# Altium footprint library SMD-RCL.PcbLib: 111 footprints (part 7 of 7)
Each footprint in its own frame and in the unit in brackets; x right, y up, seen from the top. Pads: shape width x height; smd on the part's side, far side on the other; paste and mask are expansions set on the pad; w line width, h text height; cw(c..) or ccw(c..) is an arc to the next point about the centre after c.
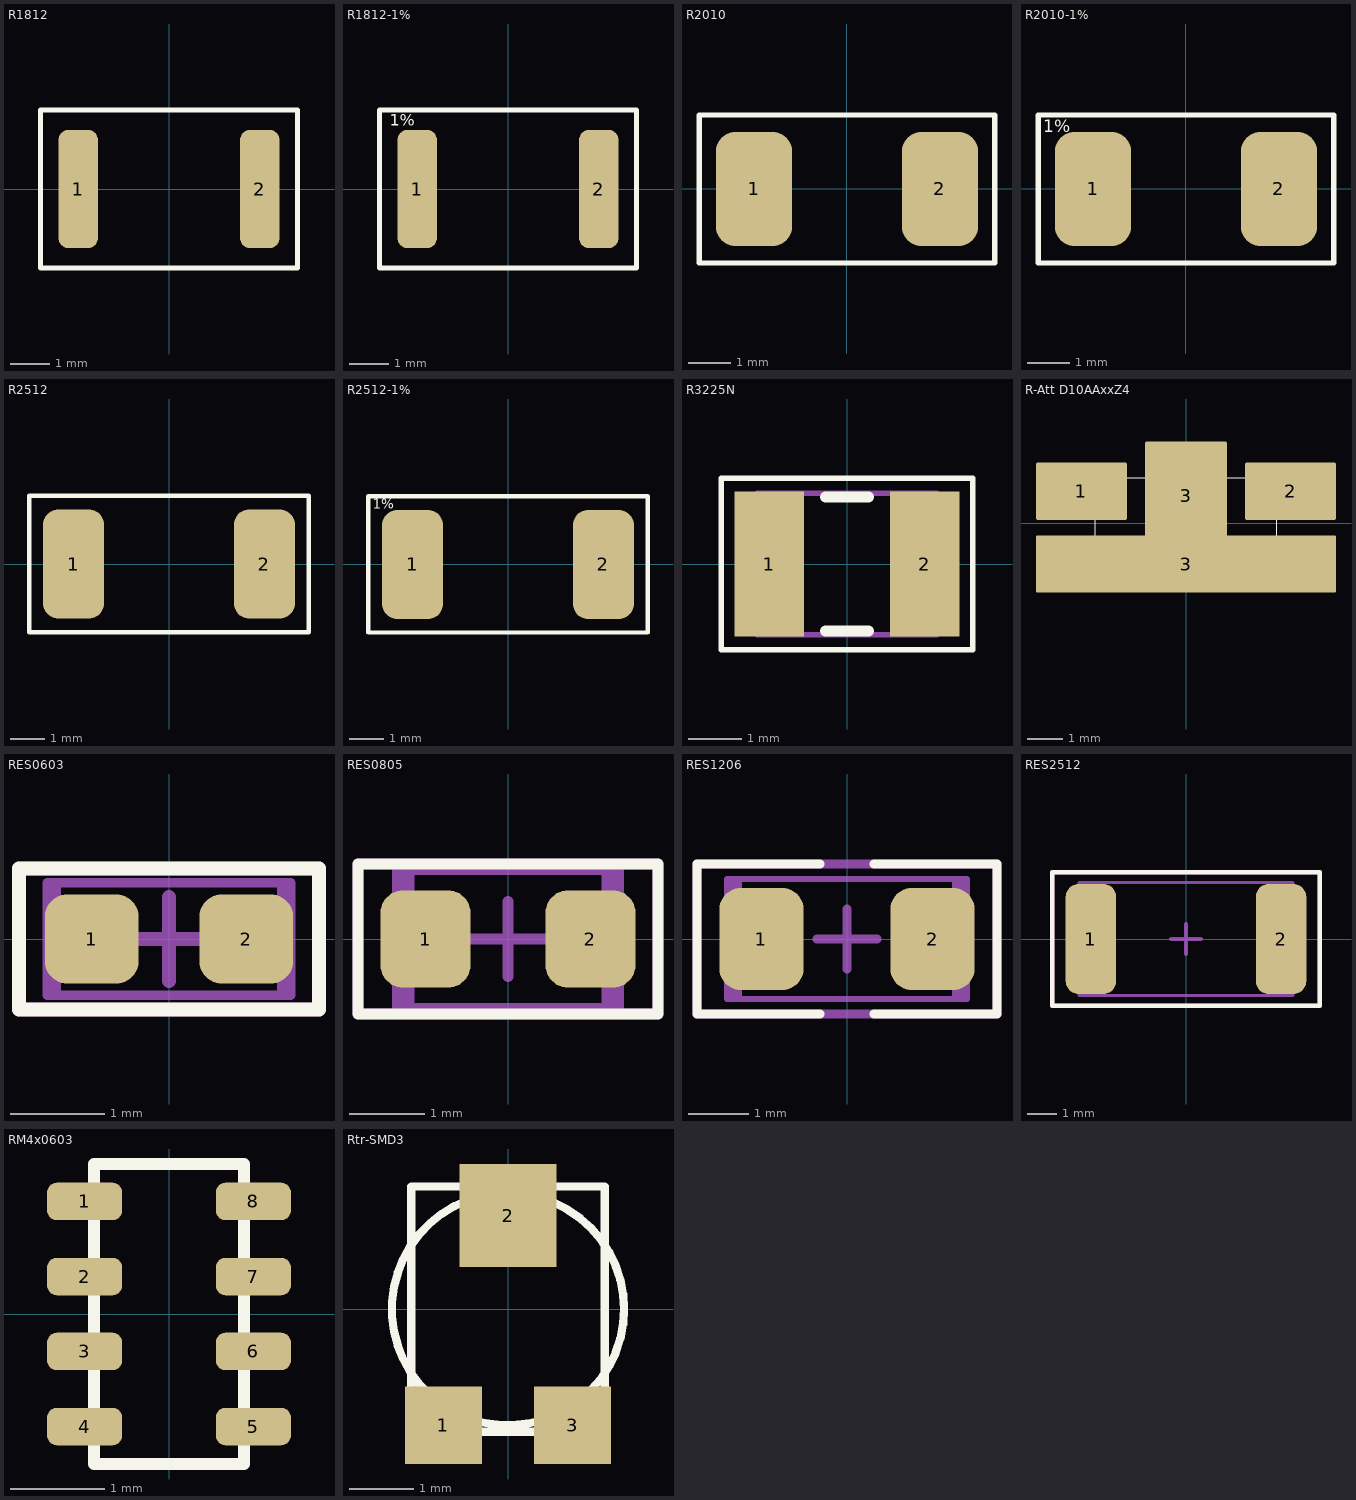
[diagram p6: the footprints below, top view; thin cyan lines are the x and y axes]

## R1812 [mm]
pads (2):
  rrect50% 1x3 smd: 1(-2.3,0) 2(2.3,0)
Top Overlay:
  lines w0.125: -3.25,-2 -3.25,2 3.25,2 3.25,-2 -3.25,-2
3D body "SMD R-1812.STEP": height 0.6, standoff 0, extent -2.25,-1.6 2.25,1.6

## R1812-1% [mm]
pads (2):
  rrect50% 1x3 smd: 1(-2.3,0) 2(2.3,0)
Top Overlay:
  lines w0.125: -3.25,-2 3.25,-2 3.25,2 -3.25,2 -3.25,-2
  text "1%" at -3,1.5 h0.5
3D body "SMD R-1812-1%.STEP": height 0.6, standoff 0, extent -2.276,-1.6 2.224,1.6

## R2010 [mm]
pads (2):
  rrect50% 1.8x2.7 smd: 1(-2.2,0) 2(2.2,0)
Top Overlay:
  lines w0.125: -3.5,-1.75 -3.5,1.75 3.5,1.75 3.5,-1.75 -3.5,-1.75
3D body "SMD R-2010.STEP": height 0.62, standoff 0, extent -2.502,-1.244 2.502,1.246

## R2010-1% [mm]
pads (2):
  rrect50% 1.8x2.7 smd: 1(-2.2,0) 2(2.2,0)
Top Overlay:
  lines w0.125: -3.5,-1.75 3.5,-1.75 3.5,1.75 -3.5,1.75 -3.5,-1.75
  text "1%" at -3.373,1.242 h0.5
3D body "SMD R-2010-1%.STEP": height 0.62, standoff 0, extent -2.502,-1.244 2.502,1.245

## R2512 [mm]
pads (2):
  rrect50% 1.8x3.2 smd: 1(-2.8,0) 2(2.8,0)
Top Overlay:
  lines w0.125: -4.1,-2 -4.1,2 4.1,2 4.1,-2 -4.1,-2
3D body "SMD R-2512.STEP": height 0.62, standoff 0, extent -3.159,-1.6 3.16,1.6

## R2512-1% [mm]
pads (2):
  rrect50% 1.8x3.2 smd: 1(-2.8,0) 2(2.8,0)
Top Overlay:
  lines w0.125: -4.1,-2 4.1,-2 4.1,2 -4.1,2 -4.1,-2
  text "1%" at -3.962,1.524 h0.5
3D body "SMD R-2512-1%.STEP": height 0.62, standoff 0, extent -3.159,-1.6 3.16,1.6

## R3225N [mm] "Chip Resistor, Body 3.2x2.5mm, IPC Medium Density"
height 0.71
pads (2):
  rect 1.3x2.7 smd: 1(-1.45,0) 2(1.45,0)
Top Overlay:
  lines w0.1: -2.35,-1.6 2.35,-1.6 2.35,1.6 -2.35,1.6 -2.35,-1.6
  lines w0.2: -0.4,-1.25 0.4,-1.25 ; -0.4,1.25 0.4,1.25
Assembly_draw:
  lines w0.1: -1.675,-1.32 -1.675,1.32 1.675,1.32 1.675,-1.32 -1.675,-1.32
3D body: height 0.71, standoff 0, extent -1.675,-1.32 1.675,1.32

## R-Att D10AAxxZ4 [mil]
pads (4):
  rrect5% 100x63 smd: 1(-115,35) 2(115,35)
  rrect5% 330x63 smd: 3(0,-45)
  rrect5% 90x120 smd: 3(0,30)
Top Layer:
  lines w1: -96,10 -96,45 -70,45 -70,10 -96,10 ; -88,-50 -88,-15 -40,-15 -40,45 40,45 40,-15 88,-15 88,-50 -88,-50 ; 70,10 70,45 96,45 96,10 70,10
Top Overlay:
  lines w1: -100,-50 -100,10 -98,10 ccw(c-98,12) -96,12 -96,50 96,50 96,12 ccw(c98,12) 98,10 100,10 100,-50 40,-50 40,-48 ccw(c38,-48) 38,-46 -38,-46 ccw(c-38,-48) -40,-48 -40,-50 -100,-50
3D body: height 25, standoff 0, extent -100,-50 100,50
3D body: height 26, standoff 25, extent -96,-46 96,45

## RES0603 [mm] "Chip Capacitor, 2-Leads, Body 1,60x0,83mm, IPC Medium Density"
height 0.6
pads (2):
  rrect50% 1x0.95 smd: 1(-0.825,0) 2(0.825,0)
Top Overlay:
  lines w0.15: -1.6,-0.75 -1.6,0.75 0,0.75 1.6,0.75 1.6,-0.75 0,-0.75 -1.6,-0.75
Assembly_draw:
  lines w0.1: -1.2,-0.6 -1.2,0.6 ; 1.2,-0.6 1.2,0.6 ; -1.3,-0.6 -1.3,0.6 1.3,0.6 1.3,-0.6 -1.3,-0.6
Mechanical_clearance:
  lines w0.15: -0.45,0 0.45,0 ; 0,-0.45 0,0.45 ; -1.6,-0.75 -1.6,0.75 1.6,0.75 1.6,-0.75 -1.6,-0.75
3D body "SMD R-0603.STEP": height 0.45, standoff -0.01, extent -0.8,-0.4 0.8,0.4

## RES0805 [mm] "Chip Resistor, 2-Leads, Body 2,00x1,25mm, IPC Medium Density"
height 0.7
pads (2):
  rrect50% 1.2x1.3 smd: 1(-1.1,0) 2(1.1,0)
Top Overlay:
  lines w0.15: -2,-1 2,-1 2,1 -2,1 -2,-1
Assembly_draw:
  rectangle: -1.5,-0.9 -1.3,0.9
  rectangle: 1.3,-0.9 1.5,0.9
  lines w0.1: -1.3,-0.9 -1.3,0.9 ; 1.3,-0.9 1.3,0.9 ; -1.5,-0.9 -1.5,0.9 1.5,0.9 1.5,-0.9 -1.5,-0.9
Mechanical_clearance:
  lines w0.15: -0.5,0 0.5,0 ; 0,-0.5 0,0.5 ; -2,-1 2,-1 2,1 -2,1 -2,-1
3D body "R-0805.STEP": height 0.6, standoff 0, extent -1,-0.625 1,0.625

## RES1206 [mm] "Chip Resistor, 2-Leads, Body 3,20x1,60mm, IPC Medium Density"
height 0.7
pads (2):
  rrect50% 1.4x1.7 smd: 1(-1.425,0) 2(1.425,0)
Top Overlay:
  lines w0.15: -0.45,-1.25 -2.5,-1.25 -2.5,1.25 -0.45,1.25 ; 0.45,-1.25 2.5,-1.25 2.5,1.25 0.45,1.25
Assembly_Text_Top:
  text ".Designator / .Comment" at -2.2,-0.7 h1
Assembly_draw:
  rectangle: -1.95,-1 -1.75,1
  rectangle: 1.75,-1 1.95,1
  lines w0.1: -2,-1 2,-1 2,1 -2,1 -2,-1
Mechanical_clearance:
  lines w0.15: -0.5,0 0.5,0 ; 0,-0.5 0,0.5 ; -2.5,-1.25 2.5,-1.25 2.5,1.25 -2.5,1.25 -2.5,-1.25
3D body "R-1206 (2).STEP": height 0.6, standoff 0, extent -1.6,-0.8 1.6,0.8

## RES2512 [mm]
height 0.7
pads (2):
  rrect50% 1.7x3.7 smd: 1(-3.2,0) 2(3.2,0)
Top Overlay:
  lines w0.15: -4.5,-2.25 -4.5,2.25 4.5,2.25 4.5,-2.25 -4.5,-2.25
Assembly_Text_Top:
  text ".Designator / .Comment" at -4.3,-1.5 h2
Assembly_draw:
  rectangle: 2.8,-1.9 3.6,1.9
  rectangle: -3.6,-1.9 -2.8,1.9
  lines w0.1: -3.3,-1.9 -3.3,1.9 ; 3.3,-1.9 3.3,1.9 ; -3.6,-1.9 -3.6,1.9 3.6,1.9 3.6,-1.9 -3.6,-1.9
Mechanical_clearance:
  lines w0.15: -0.5,0 0.5,0 ; 0,-0.5 0,0.5 ; -4.5,-2.25 -4.5,2.25 4.5,2.25 4.5,-2.25 -4.5,-2.25
3D body "SMD R-2512.STEP": height 0.62, standoff 0, extent -3.159,-1.6 3.16,1.6

## RM4x0603 [mm]
pads (8):
  rrect50% 0.8x0.4 smd: 1(-0.9,1.2) 2(-0.9,0.4) 3(-0.9,-0.4) 4(-0.9,-1.2) 5(0.9,-1.2) 6(0.9,-0.4) 7(0.9,0.4) 8(0.9,1.2)
Top Overlay:
  lines w0.125: -0.8,-1.6 -0.8,1.6 0.8,1.6 0.8,-1.6 -0.8,-1.6
3D body "SMD R1206-4Way-Var2-1.STEP": height 0.5, standoff 0, extent -0.8,-1.6 0.8,1.6

## Rtr-SMD3 [mm]
pads (3):
  rect 1.2x1.2 smd: 1(-1,-1.8) 3(1,-1.8)
  rect 1.5x1.6 smd: 2(0,1.45)
Top Overlay:
  circle w0.127: c0,0 r1.8
  lines w0.125: -1.5,-1.9 -1.5,1.9 1.5,1.9 1.5,-1.9 -1.5,-1.9
3D body "R tr PVZ3A.STEP": height 1.95, standoff 0, extent -1.55,-1.85 1.55,1.84

## SMD B CAP [mm]